# Altium footprint library SBCLib.PcbLib: 120 footprints (part 4 of 8)
Each footprint in its own frame and in the unit in brackets; x right, y up, seen from the top. Pads: shape width x height; smd on the part's side, far side on the other; paste and mask are expansions set on the pad; w line width, h text height; cw(c..) or ccw(c..) is an arc to the next point about the centre after c.
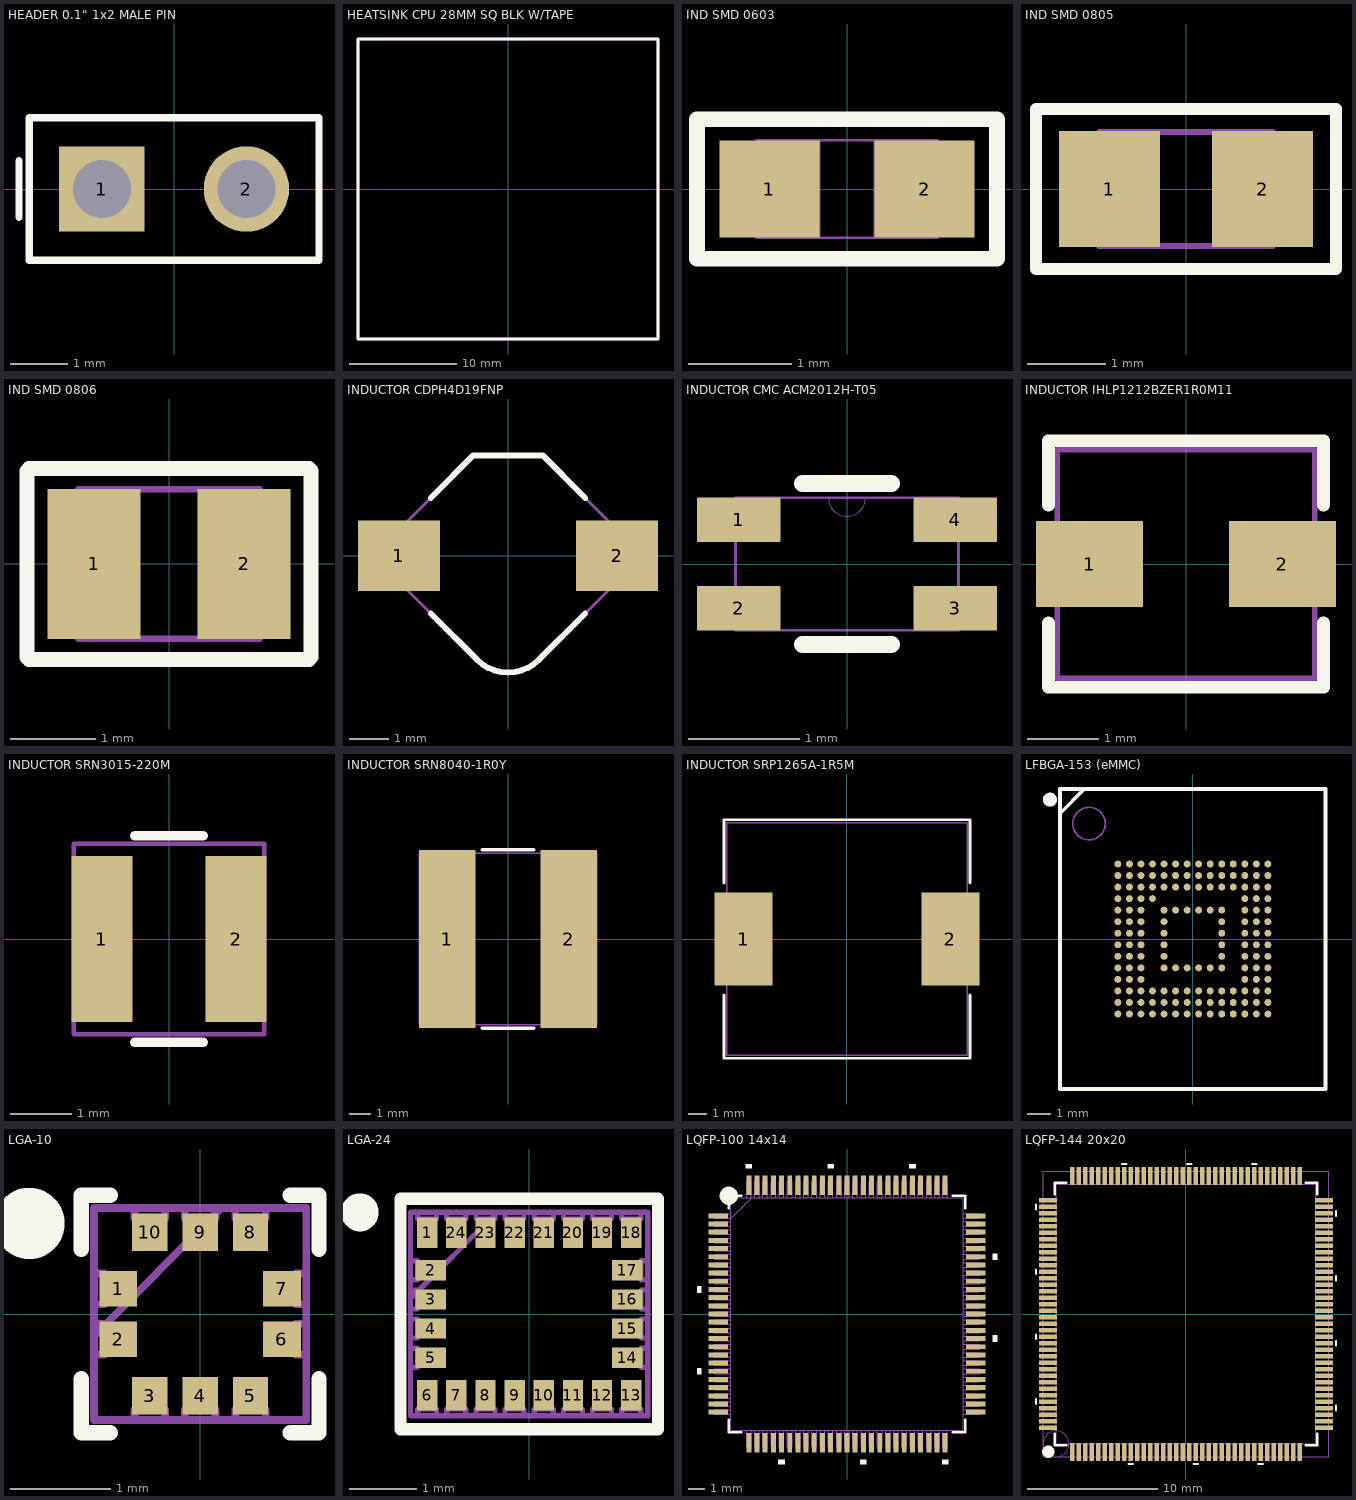
[diagram p3: the footprints below, top view; thin cyan lines are the x and y axes]

## HEADER 0.1" 1x2 MALE PIN [mm]
pads (2):
  rect 1.5x1.5 hole 1.02: 1(-1.27,0)
  round 1.5 hole 1.02: 2(1.27,0)
Top Overlay:
  lines w0.127: -2.725,-0.5 -2.725,0.5 ; -2.544,-1.25 2.544,-1.25 2.544,1.25 -2.544,1.25 -2.544,-1.25
Mechanical 3:
  lines w0.076: -2.544,-1.25 -2.544,1.25 2.544,1.25 2.544,-1.25 -2.544,-1.25
3D body "PH1-02-UA.STEP": height 8.55, standoff -3, extent -2.544,-1.25 2.544,1.25

## HEATSINK CPU 28MM SQ BLK W/TAPE [mm]
Top Overlay:
  lines w0.25: -13.97,-13.97 -13.97,13.97 13.97,13.97 13.97,-13.97 -13.97,-13.97
Mechanical 3:
  lines w0.25: -13.97,-13.97 13.97,-13.97 13.97,13.97 -13.97,13.97 -13.97,-13.97
3D body "658-60ABT1E HEATSINK CPU 28MM SQ BLK W-TAPE.step": height 17.06, standoff 1.74, extent -13.97,-13.97 13.97,13.97

## IND SMD 0603 [mil]
pads (2):
  rect 38x37 smd paste+0: 1(-29.5,0) 2(29.5,0)
Top Overlay:
  lines w6: -57.09,-26.57 -57.09,26.57 57.09,26.57 57.09,-26.57 -57.09,-26.57
Mechanical 3:
  lines w1: -34.5,-18.5 34.5,-18.5 ; -34.5,-18.5 -34.5,18.5 ; -34.5,-18.5 -34.5,18.5 ; -34.5,-18.5 -10.5,-18.5 -10.5,18.5 -34.5,18.5 ; -34.5,18.5 34.5,18.5 ; 34.5,-18.5 34.5,18.5 ; 34.5,-18.5 34.5,18.5 ; 34.5,-18.5 10.5,-18.5 10.5,18.5 34.5,18.5
3D body "IND_BLM18_0603_MUR.step": height 37.01, standoff 0, extent -34.49,-18.5 34.49,18.51

## IND SMD 0805 [mm] "LI0805H151R-10"
pads (2):
  rect 1.285x1.47 smd: 1(-0.972,0) 2(0.972,0)
Top Overlay:
  lines w0.152: -1.905,-1.016 1.905,-1.016 1.905,1.016 -1.905,1.016 -1.905,-1.016
Mechanical 3:
  lines w0.076: -1.105,-0.724 -1.105,0.724 1.105,0.724 1.105,-0.724 -1.105,-0.724
3D body "IND_LI0805H151R-10_LRD.step": height 1.09, standoff 0, extent -1.105,-0.724 1.105,0.724

## IND SMD 0806 [mm]
pads (2):
  rect 1.1x1.77 smd: 1(-0.885,0) 2(0.885,0)
Top Overlay:
  lines w0.178: -1.675,-1.1 -1.675,1.1 ; -1.65,-1.125 1.65,-1.125 ; -1.65,1.125 1.65,1.125 ; 1.675,-1.1 1.675,1.1
Mechanical 3:
  lines w0.076: -1.07,-0.88 -1.07,0.88 1.07,0.88 1.07,-0.88 -1.07,-0.88
3D body "LQM2MPN2R2NG0L.STEP": height 1, standoff 0, extent -1,-0.8 1,0.8

## INDUCTOR CDPH4D19FNP [mm]
pads (2):
  rect 2.1x1.8 smd: 1(-2.8,0) 2(2.8,0)
Top Overlay:
  lines w0.152: -1.982,-1.482 -0.794,-2.671 ccw(c0,-1.878) 0,-3 ccw(c0,-1.878) 0.794,-2.671 1.982,-1.482 ; -1.982,1.482 -0.89,2.575 0.89,2.575 1.982,1.482
Mechanical 3:
  lines w0.076: 2.675,-0.79 2.675,0.79 ; 2.675,-0.79 2.675,0.79 ; 2.675,-0.79 1.57,-1.895 0.794,-2.671 cw(c0,-1.878) 0,-3 cw(c0,-1.878) -0.794,-2.671 -1.57,-1.895 -2.675,-0.79 -2.675,0.79 -0.89,2.575 0.89,2.575 2.675,0.79
3D body: height 1, standoff 0, extent 2.5,-0.5 3,0.5
3D body: height 1, standoff 0, extent -3,-0.5 -2.5,0.5
3D body: height 2, standoff 0, extent -2.675,-3 2.675,2.575
3D body: height 2, standoff 0, extent 3.465,0 3.465,0
3D body: height 2, standoff 0, extent -0.2,2.1 -0.2,2.1
3D body: height 2, standoff 0, extent -0.2,2.1 -0.2,2.1

## INDUCTOR CMC ACM2012H-T05 [mm]
pads (4):
  rect 0.75x0.4 smd paste+0: 1(-0.975,0.4) 2(-0.975,-0.4) 3(0.975,-0.4) 4(0.975,0.4)
Top Overlay:
  lines w0.152: -0.399,-0.724 0.399,-0.724 ; -0.399,0.724 0.399,0.724
Mechanical 3:
  lines w0: -0.167,0.597 ccw(c0,0.597) 0.167,0.597
  lines w0.025: -1.003,-0.597 1.003,-0.597 1.003,0.597 -1.003,0.597 -1.003,-0.597
3D body "acm2012h-t05.step": height 1.19, standoff -0.01, extent -1.003,-0.603 0.997,0.597

## INDUCTOR IHLP1212BZER1R0M11 [mm]
pads (2):
  rect 1.5x1.2 smd: 1(-1.35,0) 2(1.35,0)
Top Overlay:
  lines w0.178: -1.925,-0.825 -1.925,-1.725 1.925,-1.725 1.925,-0.825 ; -1.925,0.825 -1.925,1.725 1.925,1.725 1.925,0.825
Mechanical 3:
  lines w0.076: -1.803,-1.6 -1.803,1.6 1.803,1.6 1.803,-1.6 -1.803,-1.6
3D body "IND_IHLP-1212BZ_VIS.step": height 2.06, standoff 0, extent -1.803,-1.6 1.803,1.6

## INDUCTOR SRN3015-220M [mil]
pads (2):
  rect 39x106 smd paste+0 mask+0: 1(-43,0) 2(43,0)
Top Overlay:
  lines w6: -21.88,-66 21.88,-66 ; -21.88,66 21.88,66
Mechanical 3:
  lines w3: -61,-61 -61,61 61,61 61,-61 -61,-61
3D body "IND_BOURNS_SRN3015.step": height 59.02, standoff 0, extent -60.98,-61.1 60.99,61.1

## INDUCTOR SRN8040-1R0Y [mil]
pads (2):
  rect 102x323 smd paste+0: 1(-110.24,0) 2(110.24,0)
Top Overlay:
  lines w6: -47.24,-161.42 47.24,-161.42 ; -47.24,161.42 47.24,161.42
Mechanical 3:
  lines w3: -160.43,-155.5 160.44,-155.5 160.44,155.52 -160.43,155.52 -160.43,-155.5
3D body "srn8040.stp": height 157.48, standoff 1.97, extent -160.43,-155.5 160.44,155.52

## INDUCTOR SRP1265A-1R5M [mm]
pads (2):
  rect 3.1x5 smd paste+0: 1(-5.55,0) 2(5.55,0)
Top Overlay:
  lines w0.152: -6.6,-3 -6.6,-6.4 6.2,-6.4 6.6,-6.4 6.6,-3 ; -6.6,3 -6.6,6.4 -6.2,6.4 6.6,6.4 6.6,3
Mechanical 3:
  lines w0.076: -6.45,-6.25 -6.45,6.25 6.45,6.25 6.45,-6.25 -6.45,-6.25
3D body "SRP1265A series.stp": height 6.31, standoff 0, extent -6.45,-6.25 6.45,6.25

## LFBGA-153 (eMMC) [mm]
pads (153):
  round 0.3 smd paste+0: A1(-3.25,3.25) A2(-2.75,3.25) A3(-2.25,3.25) A4(-1.75,3.25) A5(-1.25,3.25) A6(-0.75,3.25) A7(-0.25,3.25) A8(0.25,3.25) A9(0.75,3.25) A10(1.25,3.25) A11(1.75,3.25) A12(2.25,3.25) A13(2.75,3.25) A14(3.25,3.25) B1(-3.25,2.75) B2(-2.75,2.75) B3(-2.25,2.75) B4(-1.75,2.75) B5(-1.25,2.75) B6(-0.75,2.75) B7(-0.25,2.75) B8(0.25,2.75) B9(0.75,2.75) B10(1.25,2.75) B11(1.75,2.75) B12(2.25,2.75) B13(2.75,2.75) B14(3.25,2.75) C1(-3.25,2.25) C2(-2.75,2.25) C3(-2.25,2.25) C4(-1.75,2.25) C5(-1.25,2.25) C6(-0.75,2.25) C7(-0.25,2.25) C8(0.25,2.25) C9(0.75,2.25) C10(1.25,2.25) C11(1.75,2.25) C12(2.25,2.25) C13(2.75,2.25) C14(3.25,2.25) D1(-3.25,1.75) D2(-2.75,1.75) D3(-2.25,1.75) D4(-1.75,1.75) D12(2.25,1.75) D13(2.75,1.75) D14(3.25,1.75) E1(-3.25,1.25) E2(-2.75,1.25) E3(-2.25,1.25) E5(-1.25,1.25) E6(-0.75,1.25) E7(-0.25,1.25) E8(0.25,1.25) E9(0.75,1.25) E10(1.25,1.25) E12(2.25,1.25) E13(2.75,1.25) E14(3.25,1.25) F1(-3.25,0.75) F2(-2.75,0.75) F3(-2.25,0.75) F5(-1.25,0.75) F10(1.25,0.75) F12(2.25,0.75) F13(2.75,0.75) F14(3.25,0.75) G1(-3.25,0.25) G2(-2.75,0.25) G3(-2.25,0.25) G5(-1.25,0.25) G10(1.25,0.25) G12(2.25,0.25) G13(2.75,0.25) G14(3.25,0.25) H1(-3.25,-0.25) H2(-2.75,-0.25) H3(-2.25,-0.25) H5(-1.25,-0.25) H10(1.25,-0.25) H12(2.25,-0.25) H13(2.75,-0.25) H14(3.25,-0.25) J1(-3.25,-0.75) J2(-2.75,-0.75) J3(-2.25,-0.75) J5(-1.25,-0.75) J10(1.25,-0.75) J12(2.25,-0.75) J13(2.75,-0.75) J14(3.25,-0.75) K1(-3.25,-1.25) K2(-2.75,-1.25) K3(-2.25,-1.25) K5(-1.25,-1.25) K6(-0.75,-1.25) K7(-0.25,-1.25) K8(0.25,-1.25) K9(0.75,-1.25) K10(1.25,-1.25) K12(2.25,-1.25) K13(2.75,-1.25) K14(3.25,-1.25) L1(-3.25,-1.75) L2(-2.75,-1.75) L3(-2.25,-1.75) L12(2.25,-1.75) L13(2.75,-1.75) L14(3.25,-1.75) M1(-3.25,-2.25) M2(-2.75,-2.25) M3(-2.25,-2.25) M4(-1.75,-2.25) M5(-1.25,-2.25) M6(-0.75,-2.25) M7(-0.25,-2.25) M8(0.25,-2.25) M9(0.75,-2.25) M10(1.25,-2.25) M11(1.75,-2.25) M12(2.25,-2.25) M13(2.75,-2.25) M14(3.25,-2.25) N1(-3.25,-2.75) N2(-2.75,-2.75) N3(-2.25,-2.75) N4(-1.75,-2.75) N5(-1.25,-2.75) N6(-0.75,-2.75) N7(-0.25,-2.75) N8(0.25,-2.75) N9(0.75,-2.75) N10(1.25,-2.75) N11(1.75,-2.75) N12(2.25,-2.75) N13(2.75,-2.75) N14(3.25,-2.75) P1(-3.25,-3.25) P2(-2.75,-3.25) P3(-2.25,-3.25) P4(-1.75,-3.25) P5(-1.25,-3.25) P6(-0.75,-3.25) P7(-0.25,-3.25) P8(0.25,-3.25) P9(0.75,-3.25) P10(1.25,-3.25) P11(1.75,-3.25) P12(2.25,-3.25) P13(2.75,-3.25) P14(3.25,-3.25)
Top Overlay:
  circle w0.305: c-6.194,6.037 r0.152
  lines w0.152: -5.75,5.457 -4.707,6.5
  lines w0.178: -5.75,-6.5 5.75,-6.5 5.75,6.5 -5.75,6.5 -5.75,-6.5
Mechanical 3:
  circle w0.076: c-4.5,5 r0.707
  lines w0.076: -5.75,-6.5 5.75,-6.5 5.75,6.5 -5.75,6.5 -5.75,-6.5
3D body "User Library-153BallWFBGA.step": height 0.79, standoff -0.01, extent -5.75,-6.5 5.75,6.5

## LGA-10 [mm]
pads (10):
  rect 0.375x0.35 smd paste-0.03 mask+0.1: 1(-0.813,0.25) 2(-0.813,-0.25) 6(0.813,-0.25) 7(0.813,0.25)
  rect 0.35x0.375 smd paste-0.03 mask+0.1: 3(-0.5,-0.813) 4(0,-0.813) 5(0.5,-0.813) 8(0.5,0.813) 9(0,0.813) 10(-0.5,0.813)
Top Overlay:
  circle w0.508: c-1.7,0.9 r0.1
  lines w0.152: -1.181,-0.644 -1.181,-1.181 -0.894,-1.181 ; -1.181,0.644 -1.181,1.181 -0.894,1.181 ; 0.894,-1.181 1.181,-1.181 1.181,-0.644 ; 0.894,1.181 1.181,1.181 1.181,0.644
Mechanical 3:
  lines w0.076: -1.054,-0.216 0.216,1.054 ; -1.054,-1.054 1.054,-1.054 1.054,1.054 -1.054,1.054 -1.054,-1.054 ; -1.054,-0.402 -1.054,-0.098 -0.953,-0.098 -0.953,-0.402 -1.054,-0.402 ; -1.054,0.098 -1.054,0.402 -0.953,0.402 -0.953,0.098 -1.054,0.098 ; -0.652,-1.054 -0.348,-1.054 -0.348,-0.953 -0.652,-0.953 -0.652,-1.054 ; -0.652,0.953 -0.348,0.953 -0.348,1.054 -0.652,1.054 -0.652,0.953 ; -0.152,-1.054 0.152,-1.054 0.152,-0.953 -0.152,-0.953 -0.152,-1.054 ; -0.152,0.953 0.152,0.953 0.152,1.054 -0.152,1.054 -0.152,0.953 ; 0.348,-1.054 0.652,-1.054 0.652,-0.953 0.348,-0.953 0.348,-1.054 ; 0.348,0.953 0.652,0.953 0.652,1.054 0.348,1.054 0.348,0.953 ; 0.953,-0.402 1.054,-0.402 1.054,-0.098 0.953,-0.098 0.953,-0.402 ; 0.953,0.098 1.054,0.098 1.054,0.402 0.953,0.402 0.953,0.098
3D body "HLGA-10L_2X2X0P73_STM.step": height 0.81, standoff 0, extent -1.054,-1.054 1.054,1.054

## LGA-24 [mm] "LSM9DS1"
pads (24):
  rect 0.3x0.45 smd paste-0.025 mask+0.1: 1(-1.505,1.2) 6(-1.505,-1.2) 7(-1.075,-1.2) 8(-0.645,-1.2) 9(-0.215,-1.2) 10(0.215,-1.2) 11(0.645,-1.2) 12(1.075,-1.2) 13(1.505,-1.2) 18(1.505,1.2) 19(1.075,1.2) 20(0.645,1.2) 21(0.215,1.2) 22(-0.215,1.2) 23(-0.645,1.2) 24(-1.075,1.2)
  rect 0.45x0.3 smd paste-0.025 mask+0.1: 2(-1.45,0.645) 3(-1.45,0.215) 4(-1.45,-0.215) 5(-1.45,-0.645) 14(1.45,-0.645) 15(1.45,-0.215) 16(1.45,0.215) 17(1.45,0.645)
Top Overlay:
  circle w0.508: c-2.5,1.5 r0.025
  lines w0.178: -1.9,-1.7 -1.9,1.6 -1.9,1.7 1.9,1.7 1.9,-1.7 -1.9,-1.7
Mechanical 3:
  lines w0.076: -1.75,0.23 -0.48,1.5 ; -1.75,-1.5 1.75,-1.5 1.75,1.5 -1.75,1.5 -1.75,-1.5 ; -1.75,-0.785 -1.65,-0.785 -1.65,-0.505 -1.75,-0.505 -1.75,-0.785 ; -1.75,-0.355 -1.65,-0.355 -1.65,-0.075 -1.75,-0.075 -1.75,-0.355 ; -1.75,0.075 -1.65,0.075 -1.65,0.355 -1.75,0.355 -1.75,0.075 ; -1.75,0.505 -1.65,0.505 -1.65,0.785 -1.75,0.785 -1.75,0.505 ; -1.645,-1.5 -1.645,-1.4 -1.365,-1.4 -1.365,-1.5 -1.645,-1.5 ; -1.645,1.4 -1.645,1.5 -1.365,1.5 -1.365,1.4 -1.645,1.4 ; -1.215,-1.5 -1.215,-1.4 -0.935,-1.4 -0.935,-1.5 -1.215,-1.5 ; -1.215,1.4 -1.215,1.5 -0.935,1.5 -0.935,1.4 -1.215,1.4 ; -0.785,-1.5 -0.785,-1.4 -0.505,-1.4 -0.505,-1.5 -0.785,-1.5 ; -0.785,1.4 -0.785,1.5 -0.505,1.5 -0.505,1.4 -0.785,1.4 ; -0.355,-1.5 -0.355,-1.4 -0.075,-1.4 -0.075,-1.5 -0.355,-1.5 ; -0.355,1.4 -0.355,1.5 -0.075,1.5 -0.075,1.4 -0.355,1.4 ; 0.075,-1.5 0.075,-1.4 0.355,-1.4 0.355,-1.5 0.075,-1.5 ; 0.075,1.4 0.075,1.5 0.355,1.5 0.355,1.4 0.075,1.4 ; 0.505,-1.5 0.505,-1.4 0.785,-1.4 0.785,-1.5 0.505,-1.5 ; 0.505,1.4 0.505,1.5 0.785,1.5 0.785,1.4 0.505,1.4 ; 0.935,-1.5 0.935,-1.4 1.215,-1.4 1.215,-1.5 0.935,-1.5 ; 0.935,1.4 0.935,1.5 1.215,1.5 1.215,1.4 0.935,1.4 ; 1.365,-1.5 1.365,-1.4 1.645,-1.4 1.645,-1.5 1.365,-1.5 ; 1.365,1.4 1.365,1.5 1.645,1.5 1.645,1.4 1.365,1.4 ; 1.65,-0.785 1.65,-0.505 1.75,-0.505 1.75,-0.785 1.65,-0.785 ; 1.65,-0.355 1.65,-0.075 1.75,-0.075 1.75,-0.355 1.65,-0.355 ; 1.65,0.075 1.65,0.355 1.75,0.355 1.75,0.075 1.65,0.075 ; 1.65,0.505 1.65,0.785 1.75,0.785 1.75,0.505 1.65,0.505
3D body "LGA-24_3X3P5X1_STM.step": height 1.4, standoff 0, extent -1.75,-1.5 1.75,1.5

## LQFP-100 14x14 [mm]
pads (100):
  rect 1.2x0.3 smd paste+0 mask+0.025: 1(-7.88,6.002) 2(-7.88,5.501) 3(-7.88,5.001) 4(-7.88,4.501) 5(-7.88,4.001) 6(-7.88,3.501) 7(-7.88,3.001) 8(-7.88,2.501) 9(-7.88,2.001) 10(-7.88,1.5) 11(-7.88,1) 12(-7.88,0.5) 13(-7.88,0) 14(-7.88,-0.5) 15(-7.88,-1) 16(-7.88,-1.5) 17(-7.88,-2.001) 18(-7.88,-2.501) 19(-7.88,-3.001) 20(-7.88,-3.501) 21(-7.88,-4.001) 22(-7.88,-4.501) 23(-7.88,-5.001) 24(-7.88,-5.501) 25(-7.88,-6.002) 51(7.88,-6.002) 52(7.88,-5.501) 53(7.88,-5.001) 54(7.88,-4.501) 55(7.88,-4.001) 56(7.88,-3.501) 57(7.88,-3.001) 58(7.88,-2.501) 59(7.88,-2.001) 60(7.88,-1.5) 61(7.88,-1) 62(7.88,-0.5) 63(7.88,0) 64(7.88,0.5) 65(7.88,1) 66(7.88,1.5) 67(7.88,2.001) 68(7.88,2.501) 69(7.88,3.001) 70(7.88,3.501) 71(7.88,4.001) 72(7.88,4.501) 73(7.88,5.001) 74(7.88,5.501) 75(7.88,6.002)
  rect 0.3x1.2 smd paste+0 mask+0.025: 26(-6.002,-7.88) 27(-5.501,-7.88) 28(-5.001,-7.88) 29(-4.501,-7.88) 30(-4.001,-7.88) 31(-3.501,-7.88) 32(-3.001,-7.88) 33(-2.501,-7.88) 34(-2.001,-7.88) 35(-1.5,-7.88) 36(-1,-7.88) 37(-0.5,-7.88) 38(0,-7.88) 39(0.5,-7.88) 40(1,-7.88) 41(1.5,-7.88) 42(2.001,-7.88) 43(2.501,-7.88) 44(3.001,-7.88) 45(3.501,-7.88) 46(4.001,-7.88) 47(4.501,-7.88) 48(5.001,-7.88) 49(5.501,-7.88) 50(6.002,-7.88) 76(6.002,7.88) 77(5.501,7.88) 78(5.001,7.88) 79(4.501,7.88) 80(4.001,7.88) 81(3.501,7.88) 82(3.001,7.88) 83(2.501,7.88) 84(2.001,7.88) 85(1.5,7.88) 86(1,7.88) 87(0.5,7.88) 88(0,7.88) 89(-0.5,7.88) 90(-1,7.88) 91(-1.5,7.88) 92(-2.001,7.88) 93(-2.501,7.88) 94(-3.001,7.88) 95(-3.501,7.88) 96(-4.001,7.88) 97(-4.501,7.88) 98(-5.001,7.88) 99(-5.501,7.88) 100(-6.002,7.88)
Top Overlay:
  circle w0.508: c-7.226,7.226 r0.303
  region: -5.811,8.915 -6.192,8.915 -6.192,9.169 -5.811,9.169
  region: -0.81,8.915 -1.191,8.915 -1.191,9.169 -0.81,9.169
  region: 4.192,8.915 3.811,8.915 3.811,9.169 4.192,9.169
  region: 8.915,3.691 9.169,3.691 9.169,3.31 8.915,3.31
  region: 8.915,-1.31 9.169,-1.31 9.169,-1.691 8.915,-1.691
  region: 6.192,-8.915 5.811,-8.915 5.811,-9.169 6.192,-9.169
  region: 1.191,-8.915 0.81,-8.915 0.81,-9.169 1.191,-9.169
  region: -3.811,-8.915 -4.192,-8.915 -4.192,-9.169 -3.811,-9.169
  region: -8.915,-3.31 -9.169,-3.31 -9.169,-3.691 -8.915,-3.691
  region: -8.915,1.691 -9.169,1.691 -9.169,1.31 -8.915,1.31
  lines w0.152: -7.226,-6.474 -7.226,-7.226 -6.474,-7.226 ; -7.226,6.474 -7.226,7.226 -6.474,7.226 ; 6.474,-7.226 7.226,-7.226 7.226,-6.474 ; 6.474,7.226 7.226,7.226 7.226,6.474
Mechanical 3:
  drawing of 405 lines, arcs and shapes, not listed
3D body "LQFP_35VGT6-M.step": height 1.6, standoff 0, extent -8.103,-8.103 8.103,8.103

## LQFP-144 20x20 [mm] "STM32H735xG"
pads (144):
  rect 0.35x1.35 smd: 1(-8.75,-10.625) 2(-8.25,-10.625) 3(-7.75,-10.625) 4(-7.25,-10.625) 5(-6.75,-10.625) 6(-6.25,-10.625) 7(-5.75,-10.625) 8(-5.25,-10.625) 9(-4.75,-10.625) 10(-4.25,-10.625) 11(-3.75,-10.625) 12(-3.25,-10.625) 13(-2.75,-10.625) 14(-2.25,-10.625) 15(-1.75,-10.625) 16(-1.25,-10.625) 17(-0.75,-10.625) 18(-0.25,-10.625) 19(0.25,-10.625) 20(0.75,-10.625) 21(1.25,-10.625) 22(1.75,-10.625) 23(2.25,-10.625) 24(2.75,-10.625) 25(3.25,-10.625) 26(3.75,-10.625) 27(4.25,-10.625) 28(4.75,-10.625) 29(5.25,-10.625) 30(5.75,-10.625) 31(6.25,-10.625) 32(6.75,-10.625) 33(7.25,-10.625) 34(7.75,-10.625) 35(8.25,-10.625) 36(8.75,-10.625) 73(8.75,10.625) 74(8.25,10.625) 75(7.75,10.625) 76(7.25,10.625) 77(6.75,10.625) 78(6.25,10.625) 79(5.75,10.625) 80(5.25,10.625) 81(4.75,10.625) 82(4.25,10.625) 83(3.75,10.625) 84(3.25,10.625) 85(2.75,10.625) 86(2.25,10.625) 87(1.75,10.625) 88(1.25,10.625) 89(0.75,10.625) 90(0.25,10.625) 91(-0.25,10.625) 92(-0.75,10.625) 93(-1.25,10.625) 94(-1.75,10.625) 95(-2.25,10.625) 96(-2.75,10.625) 97(-3.25,10.625) 98(-3.75,10.625) 99(-4.25,10.625) 100(-4.75,10.625) 101(-5.25,10.625) 102(-5.75,10.625) 103(-6.25,10.625) 104(-6.75,10.625) 105(-7.25,10.625) 106(-7.75,10.625) 107(-8.25,10.625) 108(-8.75,10.625)
  rect 1.35x0.35 smd: 37(10.625,-8.75) 38(10.625,-8.25) 39(10.625,-7.75) 40(10.625,-7.25) 41(10.625,-6.75) 42(10.625,-6.25) 43(10.625,-5.75) 44(10.625,-5.25) 45(10.625,-4.75) 46(10.625,-4.25) 47(10.625,-3.75) 48(10.625,-3.25) 49(10.625,-2.75) 50(10.625,-2.25) 51(10.625,-1.75) 52(10.625,-1.25) 53(10.625,-0.75) 54(10.625,-0.25) 55(10.625,0.25) 56(10.625,0.75) 57(10.625,1.25) 58(10.625,1.75) 59(10.625,2.25) 60(10.625,2.75) 61(10.625,3.25) 62(10.625,3.75) 63(10.625,4.25) 64(10.625,4.75) 65(10.625,5.25) 66(10.625,5.75) 67(10.625,6.25) 68(10.625,6.75) 69(10.625,7.25) 70(10.625,7.75) 71(10.625,8.25) 72(10.625,8.75) 109(-10.625,8.75) 110(-10.625,8.25) 111(-10.625,7.75) 112(-10.625,7.25) 113(-10.625,6.75) 114(-10.625,6.25) 115(-10.625,5.75) 116(-10.625,5.25) 117(-10.625,4.75) 118(-10.625,4.25) 119(-10.625,3.75) 120(-10.625,3.25) 121(-10.625,2.75) 122(-10.625,2.25) 123(-10.625,1.75) 124(-10.625,1.25) 125(-10.625,0.75) 126(-10.625,0.25) 127(-10.625,-0.25) 128(-10.625,-0.75) 129(-10.625,-1.25) 130(-10.625,-1.75) 131(-10.625,-2.25) 132(-10.625,-2.75) 133(-10.625,-3.25) 134(-10.625,-3.75) 135(-10.625,-4.25) 136(-10.625,-4.75) 137(-10.625,-5.25) 138(-10.625,-5.75) 139(-10.625,-6.25) 140(-10.625,-6.75) 141(-10.625,-7.25) 142(-10.625,-7.75) 143(-10.625,-8.25) 144(-10.625,-8.75)
Top Overlay:
  circle w0.5: c-10.6,-10.6 r0.224
  lines w0.178: -11.55,-6.925 -11.55,-6.575 ; -11.55,-1.925 -11.55,-1.575 ; -11.55,3.075 -11.55,3.425 ; -11.55,8.075 -11.55,8.425 ; -10.1,-9.2 -10.1,-10.1 -9.2,-10.1 ; -10.1,9.2 -10.1,10.1 -9.2,10.1 ; -4.925,11.55 -4.575,11.55 ; -4.425,-11.55 -4.075,-11.55 ; 0.075,11.55 0.425,11.55 ; 0.575,-11.55 0.925,-11.55 ; 5.075,11.55 5.425,11.55 ; 5.575,-11.55 5.925,-11.55 ; 9.2,-10.1 10.1,-10.1 10.1,-9.2 ; 9.2,10.1 10.1,10.1 10.1,9.2 ; 11.55,-7.425 11.55,-7.075 ; 11.55,-2.425 11.55,-2.075 ; 11.55,2.575 11.55,2.925 ; 11.55,7.575 11.55,7.925
Mechanical 3:
  circle w0.076: c-10,-10 r1
  lines w0.076: -11,-11 11,-11 11,11 -11,11 -11,-11 ; -10,-10 -10,10 10,10 10,-10 -10,-10
3D body "User Library-LQFP144-1.step": height 1.58, standoff -0.02, extent -11,-11 11,11